# Altium footprint library CUSTOM PCB.PcbLib: 404 footprints (part 12 of 26)
Each footprint in its own frame and in the unit in brackets; x right, y up, seen from the top. Pads: shape width x height; smd on the part's side, far side on the other; paste and mask are expansions set on the pad; w line width, h text height; cw(c..) or ccw(c..) is an arc to the next point about the centre after c.
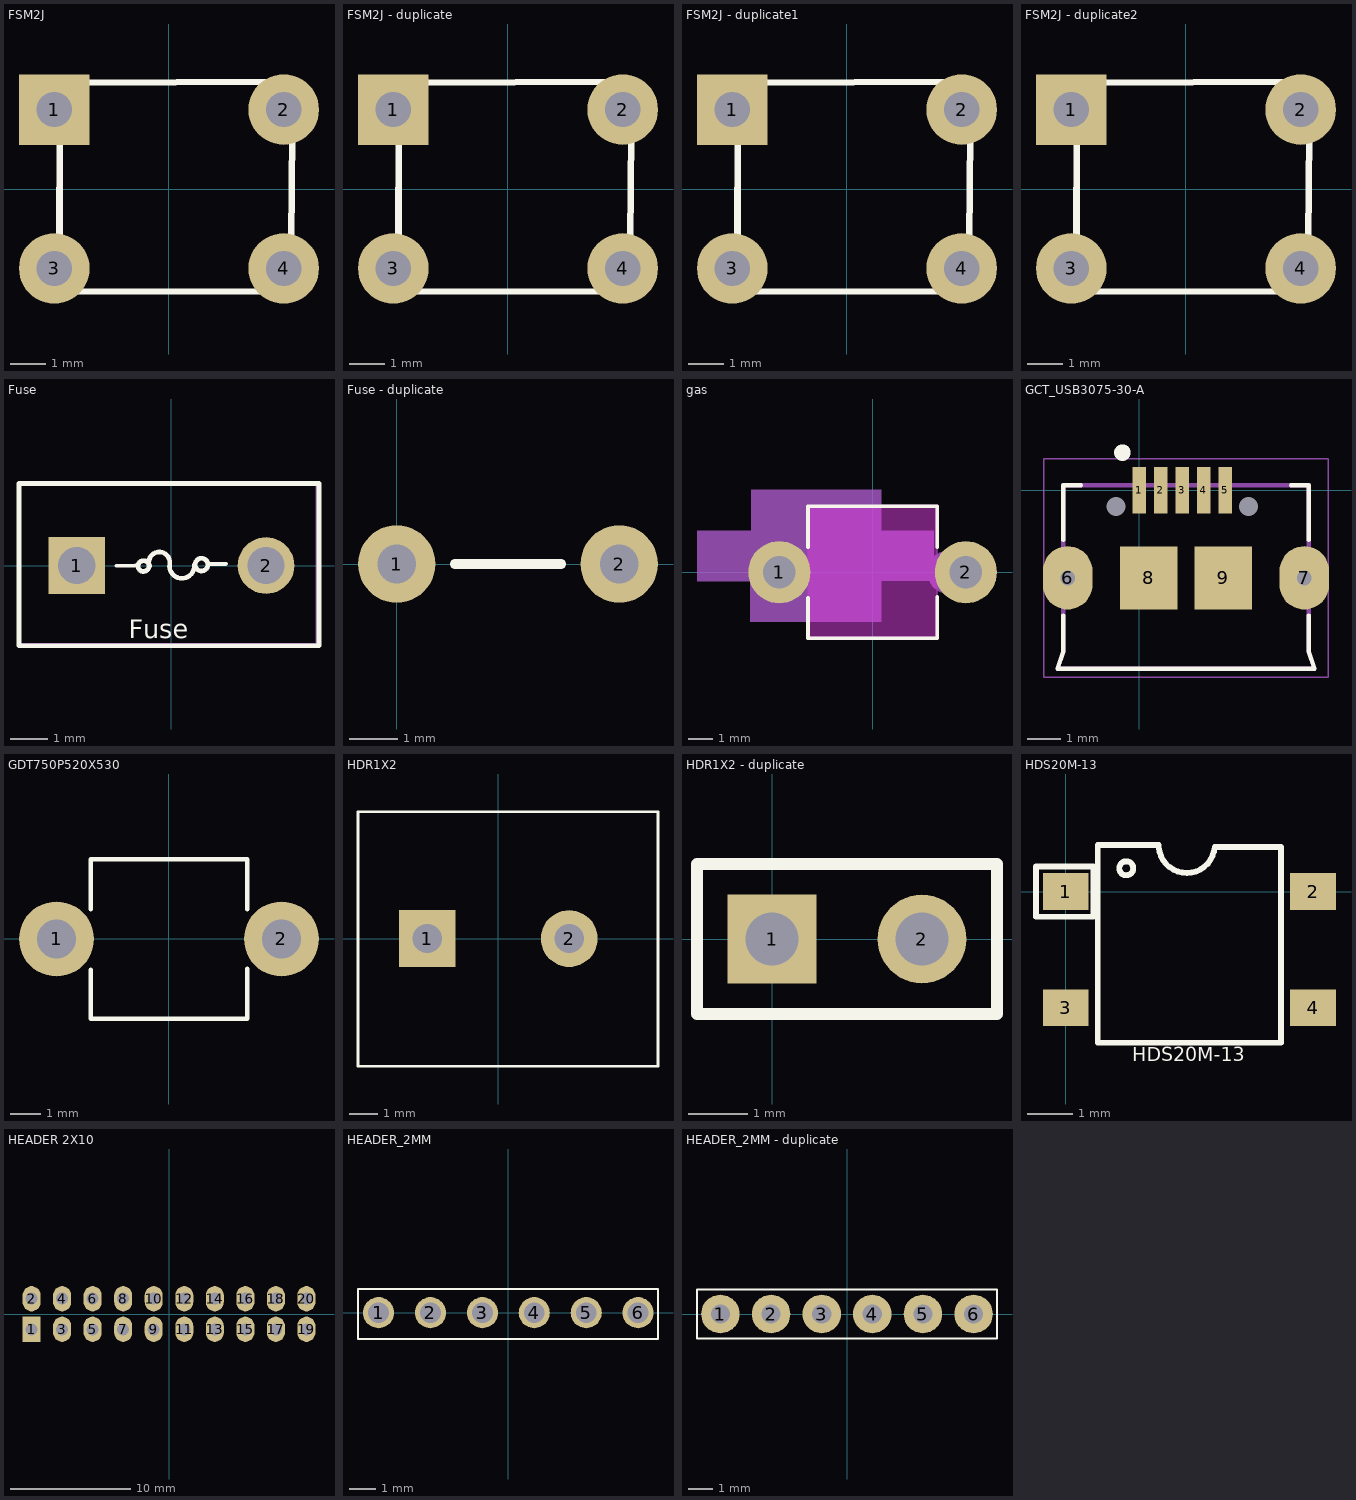
[diagram p11: the footprints below, top view; thin cyan lines are the x and y axes]

## FSM2J [mm]
pads (4):
  rect 2x2 hole 1 unplated: 1(-3.25,2.25)
  round 2 hole 1: 2(3.25,2.25) 3(-3.25,-2.25) 4(3.25,-2.25)
Top Overlay:
  lines w0.19: -3.09,3.011 3.51,3.04 3.45,-2.91 -3.11,-2.9 -3.09,3.03
3D body "tactileswitch-short.STEP": height 4.95, standoff -3.38, extent -3.896,-2.967 3.796,3.04

## FSM2J - duplicate [mm]
pads (4):
  rect 2x2 hole 1 unplated: 1(-3.25,2.25)
  round 2 hole 1: 2(3.25,2.25) 3(-3.25,-2.25) 4(3.25,-2.25)
Top Overlay:
  lines w0.19: -3.09,3.011 3.51,3.04 3.45,-2.91 -3.11,-2.9 -3.09,3.03

## FSM2J - duplicate1 [mm]
pads (4):
  rect 2x2 hole 1 unplated: 1(-3.25,2.25)
  round 2 hole 1: 2(3.25,2.25) 3(-3.25,-2.25) 4(3.25,-2.25)
Top Overlay:
  lines w0.19: -3.09,3.011 3.51,3.04 3.45,-2.91 -3.11,-2.9 -3.09,3.03
3D body "tactileswitch-short.STEP": height 4.95, standoff -3.38, extent -3.896,-2.967 3.796,3.04

## FSM2J - duplicate2 [mm]
pads (4):
  rect 2x2 hole 1 unplated: 1(-3.25,2.25)
  round 2 hole 1: 2(3.25,2.25) 3(-3.25,-2.25) 4(3.25,-2.25)
Top Overlay:
  lines w0.19: -3.09,3.011 3.51,3.04 3.45,-2.91 -3.11,-2.9 -3.09,3.03
3D body "tactileswitch-short.STEP": height 4.95, standoff -3.38, extent -3.896,-2.967 3.796,3.04

## Fuse [mil] "Specialty Fuses 2A 240VAC IND"
pads (2):
  rect 60x60 hole 39.37: 1(-100,0)
  round 60 hole 39.37: 2(100,0)
Top Overlay:
  circle w5: c31.77,1.02 r6.76
  circle w5: c-29.45,-0.51 r5.73
  lines w3.94: -58.03,-0.24 -38.27,-0.24 ccw(c-38.27,0) -38.03,0 ; 39.09,1.77 57.32,1.77 ccw(c57.32,2.01) 57.56,2.01
  lines w5: -23.18,-0.46 cw(c-12.76,3.31) -1.9,1.08 ccw(c11.03,-0.46) 23.99,0.78 ; -161.02,-84.65 155.91,-84.65 155.91,0 155.91,86.61 -161.02,86.61 -161.02,0 -161.02,-84.65
  text "Fuse" at -44.88,-76.77 h19.68
Mechanical 1:
  lines w3.94: -161,-83 ccw(c-160,-83) -160,-84 153,-84 ccw(c153,-83) 154,-83 154,87 cw(c153,87) 153,86 -161,86 -161,-83
3D body: height 303.15, standoff 0, extent -161,-83 156,86

## Fuse - duplicate [mm]
pads (2):
  round 1.6 hole 0.8: 1(0,0) 2(4.6,0)
Top Overlay:
  lines w0.2: 1.2,0 3.4,0

## gas [mm]
pads (2):
  round 2.5 hole 1.3: 1(-3.75,0) 2(3.75,0)
Top Layer keep-out:
  region: 2.6,-2.65 2.6,2.65 -2.6,2.65 -2.6,-2.65
Top Overlay:
  lines w0.15: -2.6,-1.025 -2.6,-2.65 2.6,-2.65 2.6,-1 ; -2.6,1 -2.6,2.65 2.6,2.65 2.6,1
  text ".Designator" at -0.75,3 h0.55
Mechanical 4:
  lines w0.15: -2.6,-1.025 -2.6,-2.65 2.6,-2.65 2.6,-1 ; -2.6,1 -2.6,2.65 2.6,2.65 2.6,1
  text "GT1" at -0.75,3 h0.55
Mechanical 15:
  text "2" at 3.496,0 h0.64
  text "1" at -4.004,0 h0.64
Mechanical 16:
  lines w0.025: -3.75,-0.439 -2.6,-0.439 ; -3.75,0.441 -2.6,0.441 ; -3.723,-0.44 cw(c-3.753,0) -3.723,0.44 ; 2.601,-0.44 3.751,-0.44 ; 2.601,0.44 3.751,0.44 ; 3.723,-0.44 ccw(c3.753,0) 3.723,0.44 ; -2.6,-2.65 2.6,-2.65 2.6,2.65 -2.6,2.65 -2.6,-2.65
Mechanical 17:
  pour cut-out: 1.913,0.66 1.878,0.832 1.781,0.978 1.636,1.075 1.464,1.109 1.292,1.075 1.147,0.978 1.05,0.832 1.015,0.66 1.05,0.489 1.147,0.343 1.292,0.246 1.464,0.212 1.636,0.246 1.781,0.343 1.878,0.489
  pour cut-out: -5.587,0.66 -5.622,0.832 -5.719,0.978 -5.864,1.075 -6.036,1.109 -6.208,1.075 -6.353,0.978 -6.45,0.832 -6.485,0.66 -6.45,0.489 -6.353,0.343 -6.208,0.246 -6.036,0.212 -5.864,0.246 -5.719,0.343 -5.622,0.489
  pour cut-out: -4.987,0.66 -5.022,0.832 -5.119,0.978 -5.264,1.075 -5.436,1.109 -5.608,1.075 -5.753,0.978 -5.85,0.832 -5.885,0.66 -5.85,0.489 -5.753,0.343 -5.608,0.246 -5.436,0.212 -5.264,0.246 -5.119,0.343 -5.022,0.489
  pour cut-out: 1.313,0.66 1.278,0.832 1.181,0.978 1.036,1.075 0.864,1.109 0.692,1.075 0.547,0.978 0.45,0.832 0.415,0.66 0.45,0.489 0.547,0.343 0.692,0.246 0.864,0.212 1.036,0.246 1.181,0.343 1.278,0.489
Mechanical 18:
  drawing of 7 lines, arcs and shapes, not listed
Mechanical 19:
  pour cut-out: -4.911,-1.99 0.339,-1.99 0.339,-0.34 2.464,-0.34 2.464,1.66 0.339,1.66 0.339,3.31 -4.886,3.31 -4.886,1.66 -7.061,1.66 -7.061,-0.365 -4.911,-0.365
Mechanical 20:
  drawing of 2 lines, arcs and shapes, not listed
Mechanical 21:
  text "430-00147" at -4.572,2.06 h0.64
  text "DFA=THRU-HOLE" at -5.488,-0.84 h0.64
  text "HEIGHT=5.3mm" at -5.209,-1.84 h0.64
Mechanical 22:
  text "2.1" at -3.048,0.66 h0.64
3D body: height 3.81, standoff 0, extent 3.301,-0.449 4.199,0.449
3D body: height 3.81, standoff 0, extent -4.199,-0.449 -3.301,0.449
3D body: height 3.81, standoff 0, extent -4.199,-0.449 -3.301,0.449
3D body: height 3.81, standoff 0, extent 3.301,-0.449 4.199,0.449
3D body: height 3.81, standoff 0, extent -2.6,-2.65 2.6,2.65
3D body: height 3.81, standoff 0, extent -4.183,-0.44 -2.625,0.44
3D body: height 3.81, standoff 0, extent 2.625,-0.44 4.183,0.44
3D body: height 3.81, standoff 0, extent -3.599,-0.449 -2.701,0.449
3D body: height 3.81, standoff 0, extent 2.701,-0.449 3.599,0.449
3D body: height 3.81, standoff 0, extent -3.599,-0.449 -2.701,0.449
3D body: height 3.81, standoff 0, extent 2.701,-0.449 3.599,0.449

## GCT_USB3075-30-A [mm]
pads (11):
  rect 0.4x1.4 smd: 1(0,0) 2(0.65,0) 3(1.3,0) 4(1.95,0) 5(2.6,0)
  oval 1.5x1.916 hole 0.45: 6(-2.164,-2.65) 7(4.986,-2.65)
  rect 1.75x1.9 smd: 8(0.286,-2.65) 9(2.536,-2.65)
  round 0 hole 0.57: 10(-0.7,-0.5) 11(3.3,-0.5)
Top Overlay:
  circle w0.4: c-0.51,1.135 r0.05
  lines w0.127: -2.297,-3.793 -2.297,-4.86 -2.475,-5.4 5.297,-5.4 5.119,-4.86 5.119,-3.793 ; -2.297,-1.507 -2.297,0.15 -1.764,0.15 ; 4.586,0.15 5.119,0.15 5.119,-1.507
Mechanical 1:
  lines w0: -2.389,-3.05 ccw(c-2.164,-3.05) -2.164,-3.275 ccw(c-2.164,-3.05) -1.939,-3.05 -1.939,-2.25 ccw(c-2.164,-2.25) -2.164,-2.025 ccw(c-2.164,-2.25) -2.389,-2.25 -2.389,-3.05 ; 4.761,-3.05 ccw(c4.986,-3.05) 4.986,-3.275 ccw(c4.986,-3.05) 5.211,-3.05 5.211,-2.25 ccw(c4.986,-2.25) 4.986,-2.025 ccw(c4.986,-2.25) 4.761,-2.25 4.761,-3.05
Mechanical 4:
  lines w0.127: -2.475,-5.4 5.297,-5.4 ; -2.475,-5.4 -2.297,-4.86 ; -2.475,-5.4 5.297,-5.4 ; -2.475,-5.4 -2.297,-4.86 ; -2.297,-4.86 -2.297,0.15 ; -2.297,-4.86 -2.297,0.15 ; -2.297,0.15 5.119,0.15 ; -2.297,0.15 5.119,0.15 ; 5.119,-4.86 5.297,-5.4 ; 5.119,-4.86 5.119,0.15 ; 5.119,-4.86 5.297,-5.4 ; 5.119,-4.86 5.119,0.15
Mechanical 16:
  lines w0.05: -2.889,-5.65 -2.889,0.95 5.711,0.95 5.711,-5.65 -2.889,-5.65

## GDT750P520X530 [mm]
pads (2):
  round 2.5 hole 1.3: 1(-3.75,0) 2(3.75,0)
Top Overlay:
  lines w0.15: -2.6,-1.025 -2.6,-2.65 2.6,-2.65 2.6,-1 ; -2.6,1 -2.6,2.65 2.6,2.65 2.6,1
Mechanical 15:
  text "2" at 3.496,0 h0.64
  text "1" at -4.004,0 h0.64

## HDR1X2 [mm] "Connector; Header; 2 Position"
pads (2):
  rect 2x2 hole 1.027: 1(-2.5,0)
  round 2 hole 1.027: 2(2.5,0)
Top Overlay:
  lines w0.09: -4.938,-4.5 -4.938,4.472 5.628,4.468 5.628,-4.5 -4.938,-4.5
3D body "Screw Terminal Block 5mm.SLDPRT": height 12.6, standoff -4.3, extent -4.972,-4.5 5.628,4.5

## HDR1X2 - duplicate [mm] "Connector; Header; 2 Position, 0.8D"
pads (2):
  rect 1.5x1.5 hole 0.9: 1(0,0)
  round 1.5 hole 0.9: 2(2.54,0)
Top Overlay:
  lines w0.2: -1.27,-1.27 -1.27,1.27 3.81,1.27 3.81,-1.27 -1.27,-1.27

## HDS20M-13 [mm] "Bridge Rectifiers Bridge Rectifier HDS"
pads (4):
  rect 1x0.8 all layers, no hole: 1(0,0) 2(5.4,0) 3(0,-2.54) 4(5.4,-2.54)
Top Overlay:
  circle w0.127: c1.321,0.508 r0.152
  lines w0.127: -0.65,0.55 -0.65,-0.55 0.6,-0.55 0.6,0.55 -0.6,0.55 ; 2.032,0.965 ccw(c2.642,1.016) 3.252,0.969 4.7,0.969 4.7,-3.302 0.7,-3.302 0.7,1.016 1.524,1.016 2.032,1.016
  text "HDS20M-13" at 1.45,-3.7 h0.3
3D body "User Library-SOP-4.step": height 2.02, standoff -0.02, extent -0.656,-3.322 6.204,0.678

## HEADER 2X10 [mm]
pads (20):
  rect 1.5x2.1 hole 1: 1(-11.43,-1.27)
  oval 1.5x2.1 hole 1: 2(-11.43,1.27) 3(-8.89,-1.27) 4(-8.89,1.27) 5(-6.35,-1.27) 6(-6.35,1.27) 7(-3.81,-1.27) 8(-3.81,1.27) 9(-1.27,-1.27) 10(-1.27,1.27) 11(1.27,-1.27) 12(1.27,1.27) 13(3.81,-1.27) 14(3.81,1.27) 15(6.35,-1.27) 16(6.35,1.27) 17(8.89,-1.27) 18(8.89,1.27) 19(11.43,-1.27) 20(11.43,1.27)
3D body "ZW-10-15-S-D-290-118.x_t": height 13, standoff -3, extent -12.7,-2.54 12.7,2.54

## header 3 pin [mm]

## HEADER_2MM [mm]
pads (6):
  round 1.2 hole 0.8: 1(-5,0) 2(-3,0) 3(-1,0) 4(1,0) 5(3,0) 6(5,0)
Top Overlay:
  lines w0.076: -5.791,-1.016 -1.988,-1.016 5.766,-1.016 5.766,0.914 -1.988,0.914 -5.791,0.914 -5.791,-1.016

## HEADER_2MM - duplicate [mm]
pads (6):
  round 1.6 hole 0.8: 1(-5.25,0) 2(-3.15,0) 3(-1.05,0) 4(1.05,0) 5(3.15,0) 6(5.25,0)
Top Overlay:
  lines w0.076: -6.223,-1.016 -6.223,1.016 -1.886,1.016 6.223,1.016 6.223,-1.016 -1.988,-1.016 -6.223,-1.016